# Altium schematic symbol library IC.SchLib: 555 symbols (part 3 of 15)
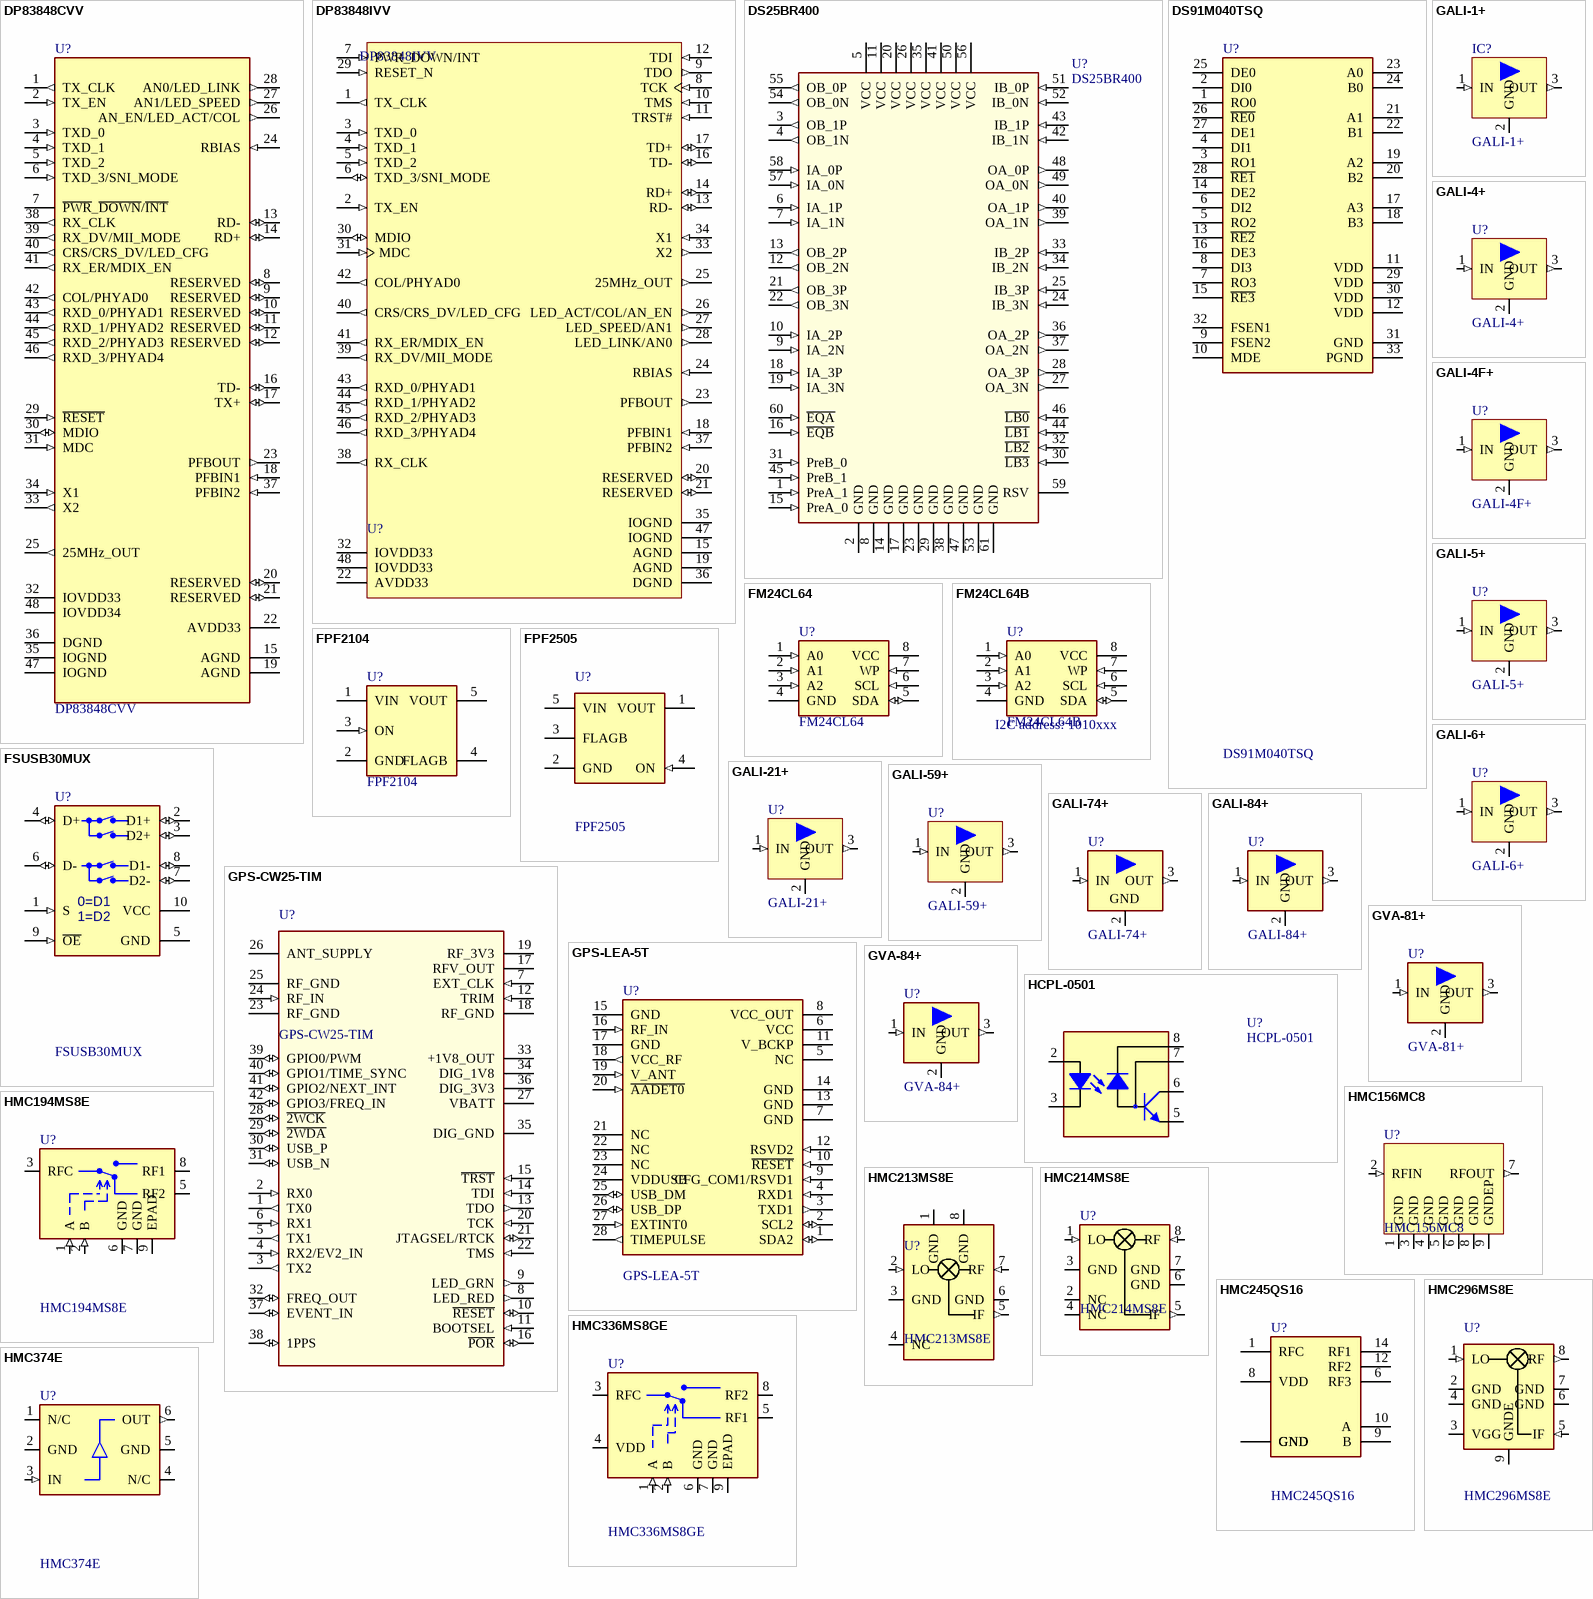
[diagram p72: symbols DP83848CVV to HMC374E]

## FPF2104
designator U?
High Side protected Switch; Manufacturer: Fairchild; Comment2: 1.8..5.5V, 0.4A; Sort: 510; Tech: SMDR; Manufacturer No: FPF2104; Package: SOT23-5; Price: 0
footprint SOT23-5
pins: 1 VIN (power), 2 GND (power), 3 ON (in), 4 FLAGB (oc), 5 VOUT (power)

## FPF2505
designator U?
High Side protected Switch; Manufacturer: Fairchild; Comment2: 4.5..20V, 0.8A; Sort: 510; Tech: SMDR; Manufacturer No: FPF2505; Package: SOT23-5; Price: 0
footprint SOT23-5
pins: 1 VOUT (power), 2 GND (power), 3 FLAGB (oc), 4 ON (in), 5 VIN (power)

## FSUSB30MUX
designator U?
Two Port High speed USB 2.0 Switch 720MHz bw; Manufacturer: Fairchild, Farnell; Manufacturer No: FSUSB30MUX, 1495465; Comment2: 3.0-4.3Vcc; Sort: 510; Tech: SMDR; Package: MSOP10; Price: 1.3; RevDate: 18.02.2009 LZ
footprint MSOP10-1 (MSOP 10pin 3x3mm R0.5mm)
pins: 1 S (in), 2 D1+ (io), 3 D2+ (io), 4 D+ (io), 5 GND (power), 6 D- (io), 7 D2- (io), 8 D1- (io), 9 ~{OE} (in), 10 VCC (power)
text: 0=D1; 1=D2

## GALI-1+
designator IC?
Monolithic Amplifier DC - 8GHz; Manufacturer: MiniCircuits; Sort: 510; Tech: SMDR; Manufacturer No: GALI-1+; Package: SOT89; Price: 0
footprint SOT89-1 (SOT-89; Body 4.6 x 4.25 mm, inc. leads (LxW max))
pins: 1 IN (in), 2 GND (power), 3 OUT (out)

## GALI-4+
designator U?
Monolithic Amplifier DC - 4GHz; Manufacturer: MiniCircuits; Sort: 510; Tech: SMDR; Manufacturer No: GALI-4+; Package: SOT89; Price: 0
footprint SOT89-1 (SOT-89; Body 4.6 x 4.25 mm, inc. leads (LxW max))
pins: 1 IN (in), 2 GND (power), 3 OUT (out)

## GALI-4F+
designator U?
Monolithic Amplifier DC - 1GHz; Manufacturer: MiniCircuits; Sort: 510; Tech: SMDR; Manufacturer No: GALI-4F+; Package: SOT89; Price: 0
footprint SOT89-1 (SOT-89; Body 4.6 x 4.25 mm, inc. leads (LxW max))
pins: 1 IN (in), 2 GND (power), 3 OUT (out)

## GALI-5+
designator U?
Monolithic Amplifier; Manufacturer: Mini Circuits; Sort: 510; Tech: SMDR; Manufacturer No: GALI-5+; Package: SOT89; Price: 0
footprint SOT89-1 (SOT-89; Body 4.6 x 4.25 mm, inc. leads (LxW max))
pins: 1 IN (in), 2 GND (power), 3 OUT (out)

## GALI-6+
designator U?
Monolithic Amplifier; Manufacturer: Mini Circuits; Sort: 510; Tech: SMDR; Manufacturer No: GALI-6+; Package: SOT89; Price: 0
footprint SOT89-1 (SOT-89; Body 4.6 x 4.25 mm, inc. leads (LxW max))
pins: 1 IN (in), 2 GND (power), 3 OUT (out)

## GALI-21+
designator U?
Monolithic Amplifier DC - 8GHz; Manufacturer: MiniCircuits; Comment2: out.pow. 18.2 dBm; Sort: 510; Tech: SMDR; Manufacturer No: GALI-21+; Package: SOT89; Price: 0
footprint SOT89-1 (SOT-89; Body 4.6 x 4.25 mm, inc. leads (LxW max))
pins: 1 IN (in), 2 GND (power), 3 OUT (out)

## GALI-59+
designator U?
Monolithic Amplifier DC - 5GHz; Manufacturer: MiniCircuits; Comment2: out.pow. 17.6 dBm; Sort: 510; Tech: SMDR; Manufacturer No: GALI-59+; Package: SOT89; Price: 0
footprint SOT89-1 (SOT-89; Body 4.6 x 4.25 mm, inc. leads (LxW max))
pins: 1 IN (in), 2 GND (power), 3 OUT (out)

## GALI-74+
designator U?
Monolithic Amplifier DC - 1GHz; Manufacturer: MiniCircuits; Comment2: +7~+15Vcc 80mAcc 20dBgain 4,8Vwp; Sort: 510; Tech: SMDR; Manufacturer No: GALI-74+; Package: SOT89; Price: 0
footprint SOT89-1 (SOT-89; Body 4.6 x 4.25 mm, inc. leads (LxW max))
pins: 1 IN (in), 2 GND (power), 3 OUT (out)

## GALI-84+
designator U?
Monolithic Amplifier DC - 1GHz; Manufacturer: MiniCircuits; Sort: 530; Tech: SMDR; Manufacturer No: GALI-84+; Package: SOT89; Price: 0
footprint SOT89-1 (SOT-89; Body 4.6 x 4.25 mm, inc. leads (LxW max))
pins: 1 IN (in), 2 GND (power), 3 OUT (out)

## GPS-CW25-TIM
designator U?
CW25-TIM GPS receiver; Manufacturer: NavSync; Sort: 520; Tech: SMDR; Manufacturer No: CW25-TIM; Package: Module 25x27X4mm; Price: 0
signal-integrity model Model Name (Model Description)
footprint GPS-CW25-TIM (GPS Module 27x25mm 42pin; RFin pin omited)
pins: 1 TX0 (out), 2 RX0 (in), 3 TX2 (out), 4 RX2/EV2_IN (in), 5 TX1 (out), 6 RX1 (in), 7 EXT_CLK (in), 8 LED_RED (out), 9 LED_GRN (out), 10 ~{RESET} (io), 11 BOOTSEL (in), 12 TRIM (in), 13 TDO (out), 14 TDI (in), 15 ~{TRST} (in), 16 ~{POR} (io), 17 RFV_OUT (power), 18 RF_GND (power), 19 RF_3V3 (power), 20 TCK (in), 21 JTAGSEL/RTCK (io), 22 TMS (in), 23 RF_GND (power), 24 RF_IN (in), 25 RF_GND (power), 26 ANT_SUPPLY (power), 27 VBATT (power), 28 ~{2WCK} (io), 29 ~{2WDA} (io), 30 USB_P (io), 31 USB_N (io), 32 FREQ_OUT (io), 33 +1V8_OUT (power), 34 DIG_1V8 (power), 35 DIG_GND (power), 36 DIG_3V3 (power), 37 EVENT_IN (io), 38 1PPS (io), 39 GPIO0/PWM (io), 40 GPIO1/TIME_SYNC (io), 41 GPIO2/NEXT_INT (io), 42 GPIO3/FREQ_IN (io)

## GPS-LEA-5T
designator U?
U-blox 5 GPS and GALILEO module; Manufacturer No: LEA-5T-0-000; Manufacturer: Ublox; Tech: SMDR; Sort: 550; Package: Module 22.4x17x3mm
footprint GPS-LEA5 (17X22.4mm 28-pin GPS module)
pins: 1 SDA2 (io), 2 SCL2 (io), 3 TXD1 (out), 4 RXD1 (in), 5 NC, 6 VCC (power), 7 GND (power), 8 VCC_OUT (power), 9 CFG_COM1/RSVD1 (in), 10 ~{RESET} (in), 11 V_BCKP (power), 12 RSVD2 (in), 13 GND (power), 14 GND (power), 15 GND (power), 16 RF_IN (in), 17 GND (power), 18 VCC_RF (out), 19 V_ANT (in), 20 ~{AADET0} (in), 21 NC, 22 NC, 23 NC, 24 VDDUSB (power), 25 USB_DM (io), 26 USB_DP (io), 27 EXTINT0 (in), 28 TIMEPULSE (out)

## GVA-81+
designator U?
Monolithic Amplifier DC - 7GHz; Manufacturer: MiniCircuits; Comment2: 5V, 160mA, 10dB; Sort: 530; Tech: SMDR; Manufacturer No: GVA-81+; Package: SOT89; Price: 0
footprint SOT89-1 (SOT-89; Body 4.6 x 4.25 mm, inc. leads (LxW max))
pins: 1 IN (in), 2 GND (power), 3 OUT (out)

## GVA-84+
designator U?
Monolithic Amplifier DC - 6GHz; Manufacturer: MiniCircuits; Comment2: 5V; Sort: 530; Tech: SMDR; Manufacturer No: GVA-84+; Package: SOT89; Price: 0
footprint SOT89-1 (SOT-89; Body 4.6 x 4.25 mm, inc. leads (LxW max))
pins: 1 IN (in), 2 GND (power), 3 OUT (out)

## HCPL-0501
designator U?
Single Channel, High Speed Optocoupler; Manufacturer: Avago; Sort: 510; Tech: SMDR; Manufacturer No: HCPL-0501; Package: SO8; Price: 0
footprint OCSO8 (Optocoupler SO8 8pin)
pins: 1 NC hidden, 2 A, 3 C, 4 NC hidden, 5 GND (power), 6 Vo, 7 Vb, 8 VCC (power)

## HMC156MC8
designator U?
Mixer; Manufacturer: Hittite; Sort: 510; Tech: SMDR; Package: SOT89; Price: 0
footprint HMC156C8
pins: 1 GND (power), 2 RFIN (in), 3 GND (power), 4 GND (power), 5 GND (power), 6 GND (power), 7 RFOUT (out), 8 GND (power), 9 GNDEP (power)

## HMC194MS8E
designator U?
RF switch DC-3GHz; Manufacturer: Hittite; Sort: 510; Tech: SMDR; Manufacturer No: HMC194MS8E; Package: MSOP8; Price: 0
signal-integrity model Model Name (Model Description)
footprint MSOP8 (MSOP 8pin with power pad R0.5mm)
pins: 1 A (in), 2 B (in), 3 RFC, 5 RF2, 6 GND (power), 7 GND (power), 8 RF1, 9 EPAD (power)

## HMC213MS8E
designator U?
GaAs MMIC doublebalanced mixer 1.5 - 4.5 GHz; Manufacturer: Hittite; Sort: 510; Tech: SMDR; Manufacturer No: HMC213MS8E; Package: MS8; Price: 0
footprint MS8 (TSOP 8pin 3,0x3,0mm R0,65mm High Density NO EP)
pins: 1 GND (power), 2 LO (in), 3 GND (power), 4 NC, 5 IF (out), 6 GND (power), 7 RF (in), 8 GND (power)

## HMC214MS8E
designator U?
GaAs MMIC mixer 2.4 - 4.0 GHz; Manufacturer: Hittite; Sort: 510; Tech: SMDR; Manufacturer No: HMC214MS8E; Package: MSOP; Price: 0
footprint MS8 (TSOP 8pin 3,0x3,0mm R0,65mm High Density NO EP)
pins: 1 LO (in), 2 NC, 3 GND (power), 4 NC, 5 IF (out), 6 GND (power), 7 GND (power), 8 RF (in)

## HMC245QS16
designator U?
GaAs MMIC SP3T NON-Reflective Switch, DC - 3.5 GHz; Manufacturer: Hittite; Manufacturer No: HMC245QS16E; Sort: 510; Tech: SMDR; Package: QSOP16; Price: 0
signal-integrity model Model Name (Model Description)
footprint QSOP16 (SSOP; 16 Leads; Body Width 3.9 mm; Pitch 0.635 mm)
pins: 1 RFC, 2 GND, 3 GND, 4 GND, 5 GND, 6 RF3, 7 GND, 8 VDD, 9 B, 10 A, 11 GND, 12 RF2, 13 GND, 14 RF1, 15 GND, 16 GND

## HMC296MS8E
designator U?
Low LO Drive Double-balanced FET Mixer, 1.1 - 1.7 GHz; Manufacturer: Hittite; Sort: 510; Tech: SMDR; Manufacturer No: HMC296MS8E; Package: MS8; Price: 0
footprint MS8 (MSOP 8pin 3,0x3,0mm R0,65mm High Density NO EP)
pins: 1 LO (in), 2 GND (power), 3 VGG (power), 4 GND (power), 5 IF (in), 6 GND (power), 7 GND (power), 8 RF (out), 9 GNDE (power)

## HMC336MS8GE
designator U?
RF switch DC-6GHz; Manufacturer: Hittite; Sort: 510; Tech: SMDR; Manufacturer No: HMC336MS8GE; Package: MSOP8; Price: 0
signal-integrity model Model Name (Model Description)
footprint MSOP8G (TSOP, 8-Leads, Body 3,1x3,1mm (max), Pitch 0,65mm, IPC High Density)
pins: 1 A (in), 2 B (in), 3 RFC, 4 VDD (power), 5 RF1, 6 GND (power), 7 GND (power), 8 RF2, 9 EPAD (power)

## HMC374E
designator U?
SMT Phemt low noise amplifier, 0.3 - 3 GHz; Manufacturer: Hittite; Comment2: 0.3 - 3 GHz; +2.75 - +5.5V Vdd; Sort: 510; Tech: SMDR; Manufacturer No: HMC374E; Package: SOT23-6; Price: 0
signal-integrity model Model Name (Model Description)
footprint SOT23-6
pins: 1 N/C (hiz), 2 GND (power), 3 IN (in), 4 N/C (hiz), 5 GND (power), 6 OUT (out)

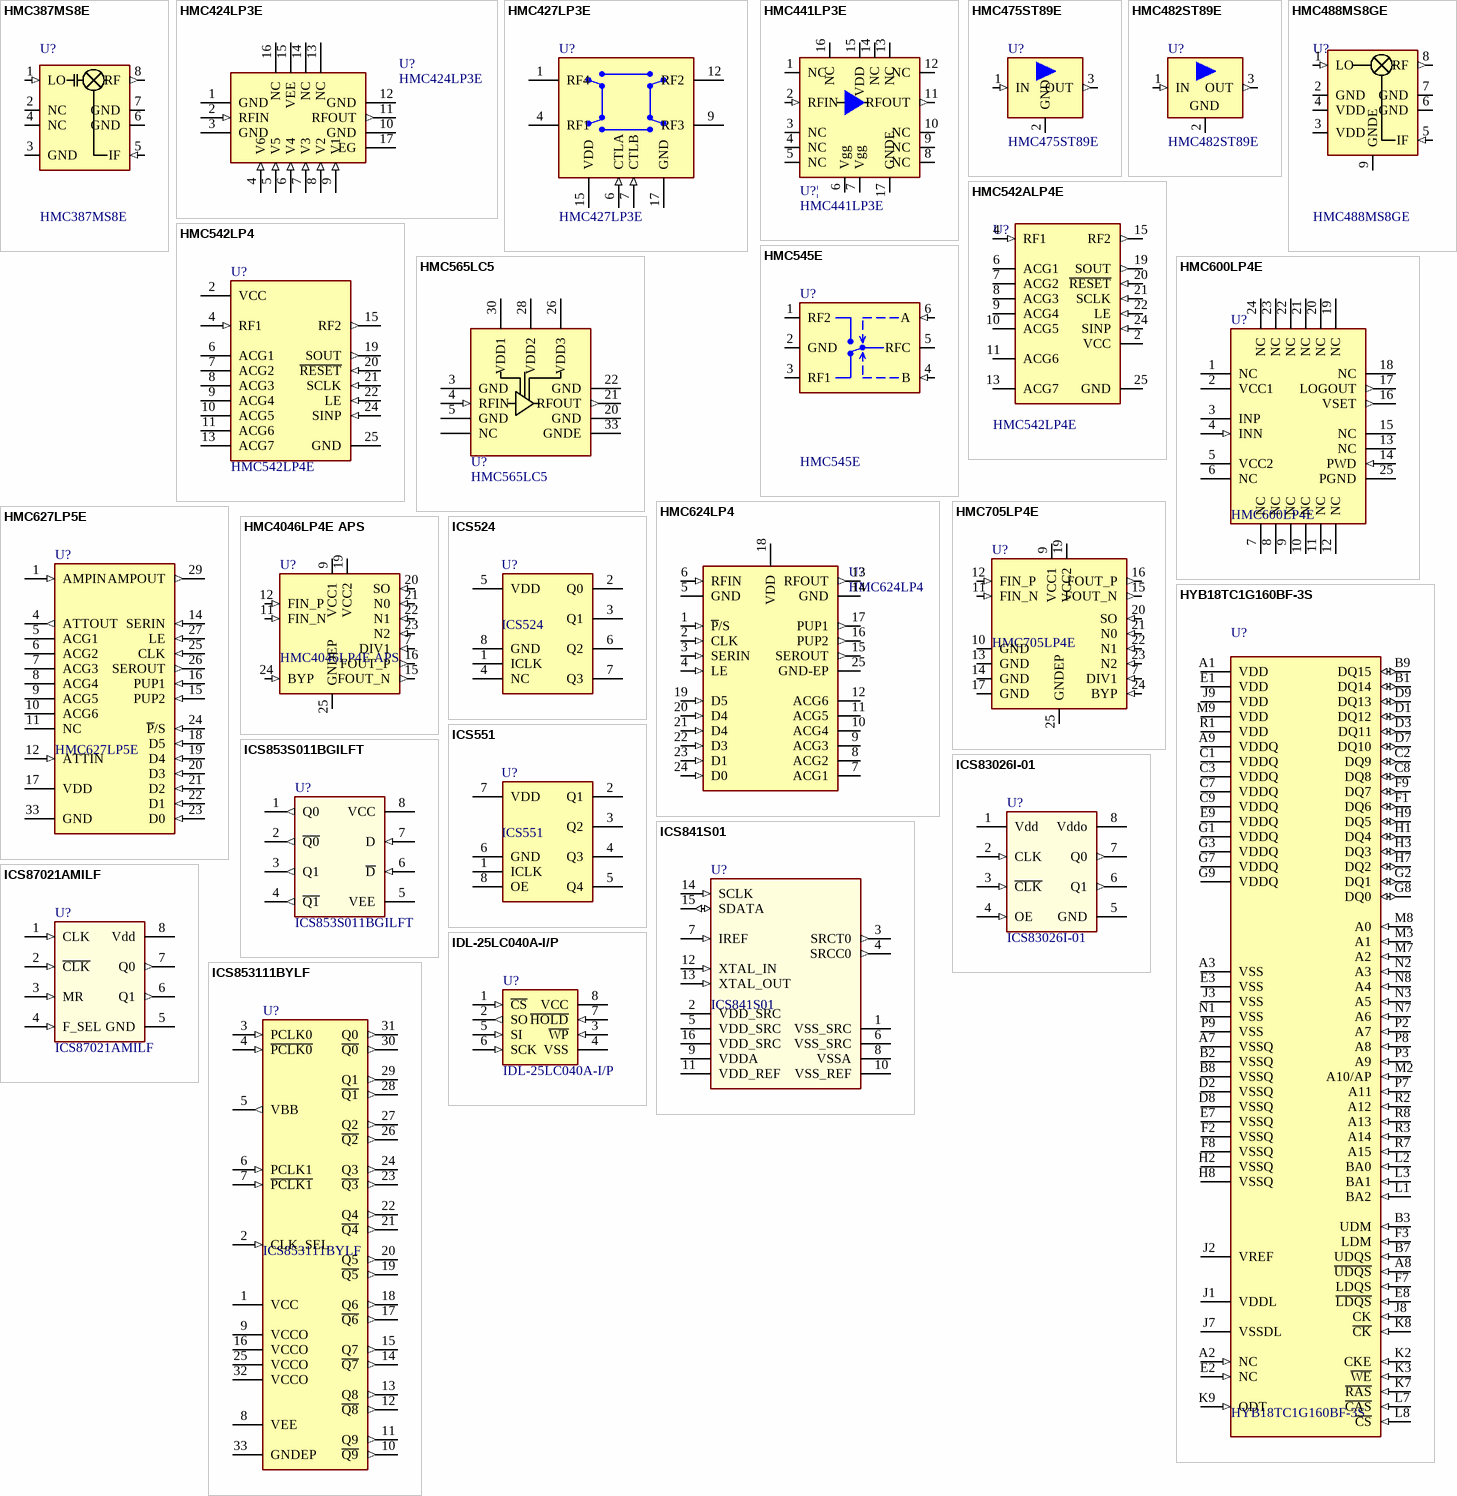
[diagram p11: symbols HMC387MS8E to IDL-25LC040A-I/P]

## HMC387MS8E
designator U?
High IP3 GaAs MMIC mixer 450 - 500 MHz; Manufacturer: Hittite; Sort: 510; Tech: SMDR; Manufacturer No: HMC387MS8E; Package: MS8; Price: 0
footprint MS8 (MSOP 8pin 3,0x3,0mm R0,65mm High Density NO EP)
pins: 1 LO (in), 2 NC, 3 GND (power), 4 NC, 5 IF (in), 6 GND (power), 7 GND (power), 8 RF (out)

## HMC424LP3E
designator U?
6-BIT digital controll attenuator  DC - 13 GHz; Manufacturer: Hittite; Sort: 510; Tech: SMDR; Manufacturer No: HMC424LP3E; Price: 0
footprint QFN16-1 (QFN16; 16 Leads; Body Width 3.0 mm; Pitch 0.5 mm)
footprint QFN16N-2 (QFN, 16-Leads, Body 3,0x3,0mm (max), Pitch 0,50mm, IPC Medium Density)
pins: 1 GND (power), 2 RFIN (in), 3 GND (power), 4 V6 (in), 5 V5 (in), 6 V4 (in), 7 V3 (in), 8 V2 (in), 9 V1 (in), 10 GND (power), 11 RFOUT (out), 12 GND (power), 13 NC, 14 NC, 15 VEE (power), 16 NC, 17 EG (power)

## HMC427LP3E
designator U?
RF switch DC-8GHz; Manufacturer: Hittite; Sort: 510; Tech: SMDR; Manufacturer No: HMC427LP3E; Package: QFN16; Price: 0
signal-integrity model Model Name (Model Description)
footprint QFN16-1 (QFN16; 16 Leads; Body Width 3.0 mm; Pitch 0.5 mm)
footprint QFN16N-2 (QFN, 16-Leads, Body 3,0x3,0mm (max), Pitch 0,50mm, IPC Medium Density)
pins: 1 RF4, 2 N/C hidden to AGND, 3 N/C hidden to AGND, 4 RF1, 5 N/C hidden to AGND, 6 CTLA (in), 7 CTLB (in), 8 N/C hidden to AGND, 9 RF3, 10 N/C hidden to AGND, 11 N/C hidden to AGND, 12 RF2, 13 N/C hidden to AGND, 14 N/C hidden to AGND, 15 VDD (power), 16 N/C hidden to AGND, 17 GND (power)

## HMC441LP3E
designator U?|
GaAs PHEMT MMIC medium power amplifier 6.5-13.5GHz; Manufacturer: Hittite; Sort: 510; Tech: SMDR; Manufacturer No: HMC441LP3E; Package: QFN16; Price: 0
footprint QFN16N-2 (QFN, 16-Leads, Body 3,0x3,0mm (max), Pitch 0,50mm, IPC Medium Density)
pins: 1 NC, 2 RFIN (in), 3 NC, 4 NC, 5 NC, 6 Vgg (power), 7 Vgg (power), 8 NC, 9 NC, 10 NC, 11 RFOUT (out), 12 NC, 13 NC, 14 NC, 15 VDD (power), 16 NC, 17 GNDE

## HMC475ST89E
designator U?
MMIC Amplifier DC - 4.5GHz; Manufacturer: Hittite; Comment2: gain 21.5dB; Sort: 530; Tech: SMDR; Manufacturer No: HMC475ST89E; Package: SOT89; Price: 0
footprint SOT89-1 (SOT-89; Body 4.6 x 4.25 mm, inc. leads (LxW max))
pins: 1 IN (in), 2 GND (power), 3 OUT (out)

## HMC482ST89E
designator U?
Monolithic Amplifier DC - 5GHz; Manufacturer: Hittite; Comment2: +6~+12Vcc 110mAcc  20dB gain; Sort: 510; Tech: SMDR; Manufacturer No: HMC482ST89E; Package: SOT89; Price: 0
footprint SOT89-1 (SOT-89; Body 4.6 x 4.25 mm, inc. leads (LxW max))
pins: 1 IN (in), 2 GND (power), 3 OUT (out)

## HMC488MS8GE
designator U?
GaAs MMIC mixer + LO amplifier 4.0-7.0 GHz; Manufacturer: Hittite; Sort: 510; Tech: SMDR; Manufacturer No: HMC488MS8GE; Package: MS8G; Price: 0
footprint MS8G (MSOP 8pin 3,0x3,0mm R0,65mm High Density EP)
pins: 1 LO (in), 2 GND (power), 3 VDD (power), 4 VDD (power), 5 IF (in), 6 GND (power), 7 GND (power), 8 RF (out), 9 GNDE (power)

## HMC542ALP4E
designator U?, comment HMC542LP4E
6-BIT digital serial controll attenuator  DC - 3.0 GHz; Manufacturer: Hittite; Sort: 510; Tech: SMDR; Manufacturer No: HMC542LP4E; Package: QFN24; Price: 0
footprint QFN24-1 (QFN24; 24 Leads; Body Width 4.0 mm; Pitch 0.5 mm)
pins: 1 GND, 2 VCC (power), 3 GND, 4 RF1 (in), 5 GND, 6 ACG1, 7 ACG2, 8 ACG3, 9 ACG4, 10 ACG5, 11 ACG6, 12 GND, 13 ACG7, 14 GND, 15 RF2 (out), 16 GND, 17 GND, 18 GND, 19 SOUT (out), 20 ~{RESET} (in), 21 SCLK (in), 22 LE (in), 23 GND, 24 SINP (in), 25 GND (power)

## HMC542LP4
designator U?, comment HMC542LP4E
6-BIT digital serial controll attenuator  DC - 3.0 GHz; Manufacturer: Hittite; Sort: 510; Tech: SMDR; Manufacturer No: HMC542LP4E; Package: QFN24; Price: 0
footprint QFN24-1 (QFN24; 24 Leads; Body Width 4.0 mm; Pitch 0.5 mm)
pins: 1 GND, 2 VCC (power), 3 GND, 4 RF1 (in), 5 GND, 6 ACG1, 7 ACG2, 8 ACG3, 9 ACG4, 10 ACG5, 11 ACG6, 12 GND, 13 ACG7, 14 GND, 15 RF2 (out), 16 GND, 17 GND, 18 GND, 19 SOUT (out), 20 ~{RESET} (in), 21 SCLK (in), 22 LE (in), 23 GND, 24 SINP (in), 25 GND (power)

## HMC545E
designator U?
GaAs MMIC SPDT switch, DC - 3 GHz; Manufacturer: Hittite; Comment2: DC - 3 GHz; +3 - +8V Vinh; Sort: 510; Tech: SMDR; Manufacturer No: HMC545E; Package: SOT23-6; Price: 0
signal-integrity model Model Name (Model Description)
footprint SOT23-6
pins: 1 RF2, 2 GND (power), 3 RF1, 4 B (in), 5 RFC, 6 A (in)

## HMC565LC5
designator U?
GaAs PHEMT low noise amplifier 6.0-20.0 GHz; Manufacturer: Hittite; Sort: 510; Tech: SMDR; Manufacturer No: HMC565LC5; Package: QFN32 5x5mm; Price: 0
footprint QFN32-1 (QFN32; 32 Leads; Body Width 5.0 mm; Pitch 0.5 mm)
pins: 1 NC, 3 GND (power), 4 RFIN (in), 5 GND (power), 20 GND (power), 21 RFOUT (out), 22 GND (power), 26 VDD3 (power), 28 VDD2 (power), 30 VDD1 (power), 33 GNDE

## HMC600LP4E
designator U?
75 dB logarithmic detector/controller 50 - 4000 MHz; Manufacturer: Hittite; Sort: 510; Tech: SMDR; Manufacturer No: HMC600LP4E; Package: QFN24; Price: 0
footprint QFN24-1 (QFN24; 24 Leads; Body Width 4.0 mm; Pitch 0.5 mm)
pins: 1 NC (power), 2 VCC1 (power), 3 INP, 4 INN (in), 5 VCC2 (power), 6 NC, 7 NC, 8 NC, 9 NC, 10 NC, 11 NC, 12 NC, 13 NC, 14 PWD (in), 15 NC, 16 VSET (out), 17 LOGOUT (out), 18 NC, 19 NC, 20 NC, 21 NC, 22 NC, 23 NC, 24 NC, 25 PGND

## HMC624LP4
designator U?
0.5dB 6-bit digital attenuator  DC - 6GHz; Manufacturer: Hittite; Manufacturer No: HMC624LP4E; Comment2: 3/5Vcc dc-6GHz; Sort: 510; Tech: SMDR; Package: QFN24; Price: 0
footprint QFN24-1 (QFN24; 24 Leads; Body Width 4.0 mm; Pitch 0.5 mm)
pins: 1 ~{P}/S (in), 2 CLK (in), 3 SERIN (in), 4 LE (in), 5 GND (power), 6 RFIN (in), 7 ACG1, 8 ACG2, 9 ACG3, 10 ACG4, 11 ACG5, 12 ACG6, 13 RFOUT (out), 14 GND (power), 15 SEROUT (out), 16 PUP2 (out), 17 PUP1 (out), 18 VDD, 19 D5 (in), 20 D4 (in), 21 D4 (in), 22 D3 (in), 23 D1 (in), 24 D0 (in), 25 GND-EP (power)

## HMC627LP5E
designator U?
0.5 dB LSB GaAs MMIC 6-bit digital variable gain amplifier, DC-6 GHz; Manufacturer: Hittite; Sort: 510; Tech: SMDR; Manufacturer No: HMC627LP5E; Package: QFN32; Price: 0
footprint QFN32-1 (QFN32  W32pin 5.0x5.0mm H0.9mm R0.5 mm PP3.5x3.5mm)
pins: 1 AMPIN (in), 2 GND (power), 3 GND (power), 4 ATTOUT (out), 5 ACG1, 6 ACG2, 7 ACG3, 8 ACG4, 9 ACG5, 10 ACG6, 11 NC, 12 ATTIN (in), 13 GND (power), 14 SERIN (in), 15 PUP2 (in), 16 PUP1 (in), 17 VDD (power), 18 D5 (in), 19 D4 (in), 20 D3 (in), 21 D2 (in), 22 D1 (in), 23 D0 (in), 24 ~{P}/S (in), 25 CLK (in), 26 SEROUT (out), 27 LE (in), 28 GND (power), 29 AMPOUT (out), 30 GND (power), 31 GND (power), 32 GND (power), 33 GND (power)

## HMC705LP4E
designator U?
2/3 Prescaler based Divider MMIC; Manufacturer: Hittite; Sort: 530; Tech: SMDR; Manufacturer No: HMC705LP4E; Package: QFN24; Price: 0
footprint QFN24-1 (QFN24; 24 Leads; Body Width 4.0 mm; Pitch 0.5 mm)
pins: 7 DIV1 (in), 9 VCC1 (power), 10 GND (power), 11 FIN_N (in), 12 FIN_P (in), 13 GND (power), 14 GND (power), 15 FOUT_N (out), 16 FOUT_P (out), 17 GND (power), 19 VCC2 (power), 20 SO (in), 21 N0 (in), 22 N1 (in), 23 N2 (in), 24 BYP (in), 25 GNDEP (power)

## HMC4046LP4E APS
designator U?
2/3 Prescaler based Divider MMIC; Manufacturer: Hittite; Sort: 530; Tech: SMDR; Price: 0
footprint QFN24-1 (QFN24; 24 Leads; Body Width 4.0 mm; Pitch 0.5 mm)
pins: 7 DIV1 (in), 9 VCC1 (power), 11 FIN_N (in), 12 FIN_P (in), 15 FOUT_N (out), 16 FOUT_P (out), 19 VCC2 (power), 20 SO (in), 21 N0 (in), 22 N1 (in), 23 N2 (in), 24 BYP (in), 25 GNDEP (power)

## HYB18TC1G160BF-3S
designator U?
1Gb Synchronous High-Speed CMOS DRAM, 128Mb x 16Bit x 16 Banks, 84-Ball FPGA, Commercial; Manufacturer: Quimonda; Sort: 510; Tech: SMDR; Package: BGA84; Manufacturer No: HYB18TC1G160BF-3S
footprint FBGA92DDR2WIDE (BGA, 84+8-Leads, Body 17,0x11,5mm,  Pitch 0,80mm)
pins: A1 VDD (power) "Power Supply", A2 NC (in), A3 VSS (power) "Ground", A7 VSSQ (power) "DQ Ground", A8 ~{UDQS} (in) "Data Strobe for DQ8-DQ15", A9 VDDQ (power) "DQ Power", B1 DQ14 (io) "Data Input/Output 14", B2 VSSQ (power) "DQ Ground", B3 UDM (in) "Input/Output Mask for DQ8-DQ15", B7 UDQS (in) "Data Strobe for DQ8-DQ15", B8 VSSQ (power) "DQ Ground", B9 DQ15 (io) "Data Input/Output 15", C1 VDDQ (power) "DQ Power", C2 DQ9 (io) "Data Input/Output 9", C3 VDDQ (power) "DQ Power", C7 VDDQ (power) "DQ Power", C8 DQ8 (io) "Data Input/Output 8", C9 VDDQ (power) "DQ Power", D1 DQ12 (io) "Data Input/Output 12", D2 VSSQ (power) "DQ Ground", D3 DQ11 (io) "Data Input/Output 11", D7 DQ10 (io) "Data Input/Output 10", D8 VSSQ (power) "DQ Ground", D9 DQ13 (io) "Data Input/Output 13", E1 VDD (power) "Power Supply", E2 NC (in), E3 VSS (power) "Ground", E7 VSSQ (power) "DQ Ground", E8 ~{LDQS} (in) "Data Strobe for DQ0-DQ7", E9 VDDQ (power) "DQ Power", F1 DQ6 (io) "Data Input/Output 6", F2 VSSQ (power) "DQ Ground", F3 LDM (in) "Input/Output Mask for DQ0-DQ7", F7 LDQS (in) "Data Strobe for DQ0-DQ7", F8 VSSQ (power) "DQ Ground", F9 DQ7 (io) "Data Input/Output 7", G1 VDDQ (power) "DQ Power", G2 DQ1 (io) "Data Input/Output 1", G3 VDDQ (power) "DQ Power", G7 VDDQ (power) "DQ Power", G8 DQ0 (io) "Data Input/Output 0", G9 VDDQ (power) "DQ Power", H1 DQ4 (io) "Data Input/Output 4", H2 VSSQ (power) "DQ Ground", H3 DQ3 (io) "Data Input/Output 3", H7 DQ2 (io) "Data Input/Output 2", H8 VSSQ (power) "DQ Ground", H9 DQ5 (io) "Data Input/Output 5", J1 VDDL (power) "DL Power", J2 VREF (power) "Vref", J3 VSS (power) "Ground", J7 VSSDL (power) "DL Ground", J8 CK (in) "Clock", J9 VDD (power) "Power Supply", K2 CKE (in) "Clock Enable", K3 ~{WE} (in) "Command Input", K7 ~{RAS} (in) "Command Input", K8 ~{CK} (in) "Clock", K9 ODT (in), L1 BA2 (in), L2 BA0 (in) "Bank Address Input 0", L3 BA1 (in) "Bank Address Input 1", L7 ~{CAS} (in) "Command Input", L8 ~{CS} (in) "Chip Select", M2 A10/AP (in) "Address Input 10", M3 A1 (in) "Address Input 1", M7 A2 (in) "Address Input 2", M8 A0 (in) "Address Input 0", M9 VDD (power) "Power Supply", N1 VSS (power) "Ground", N2 A3 (in) "Address Input 3", N3 A5 (in) "Address Input 5", N7 A6 (in) "Address Input 6", N8 A4 (in) "Address Input 4", P2 A7 (in) "Address Input 7", P3 A9 (in) "Address Input 9", P7 A11 (in) "Address Input 11", P8 A8 (in) "Address Input 8", P9 VSS (power) "Ground", R1 VDD (power) "Power Supply", R2 A12 (in) "Address Input 12", R3 A14 (in), R7 A15 (in), R8 A13 (in)